# Altium footprint library 晶体管封装库.PcbLib: 101 footprints (part 3 of 7)
Each footprint in its own frame and in the unit in brackets; x right, y up, seen from the top. Pads: shape width x height; smd on the part's side, far side on the other; paste and mask are expansions set on the pad; w line width, h text height; cw(c..) or ccw(c..) is an arc to the next point about the centre after c.
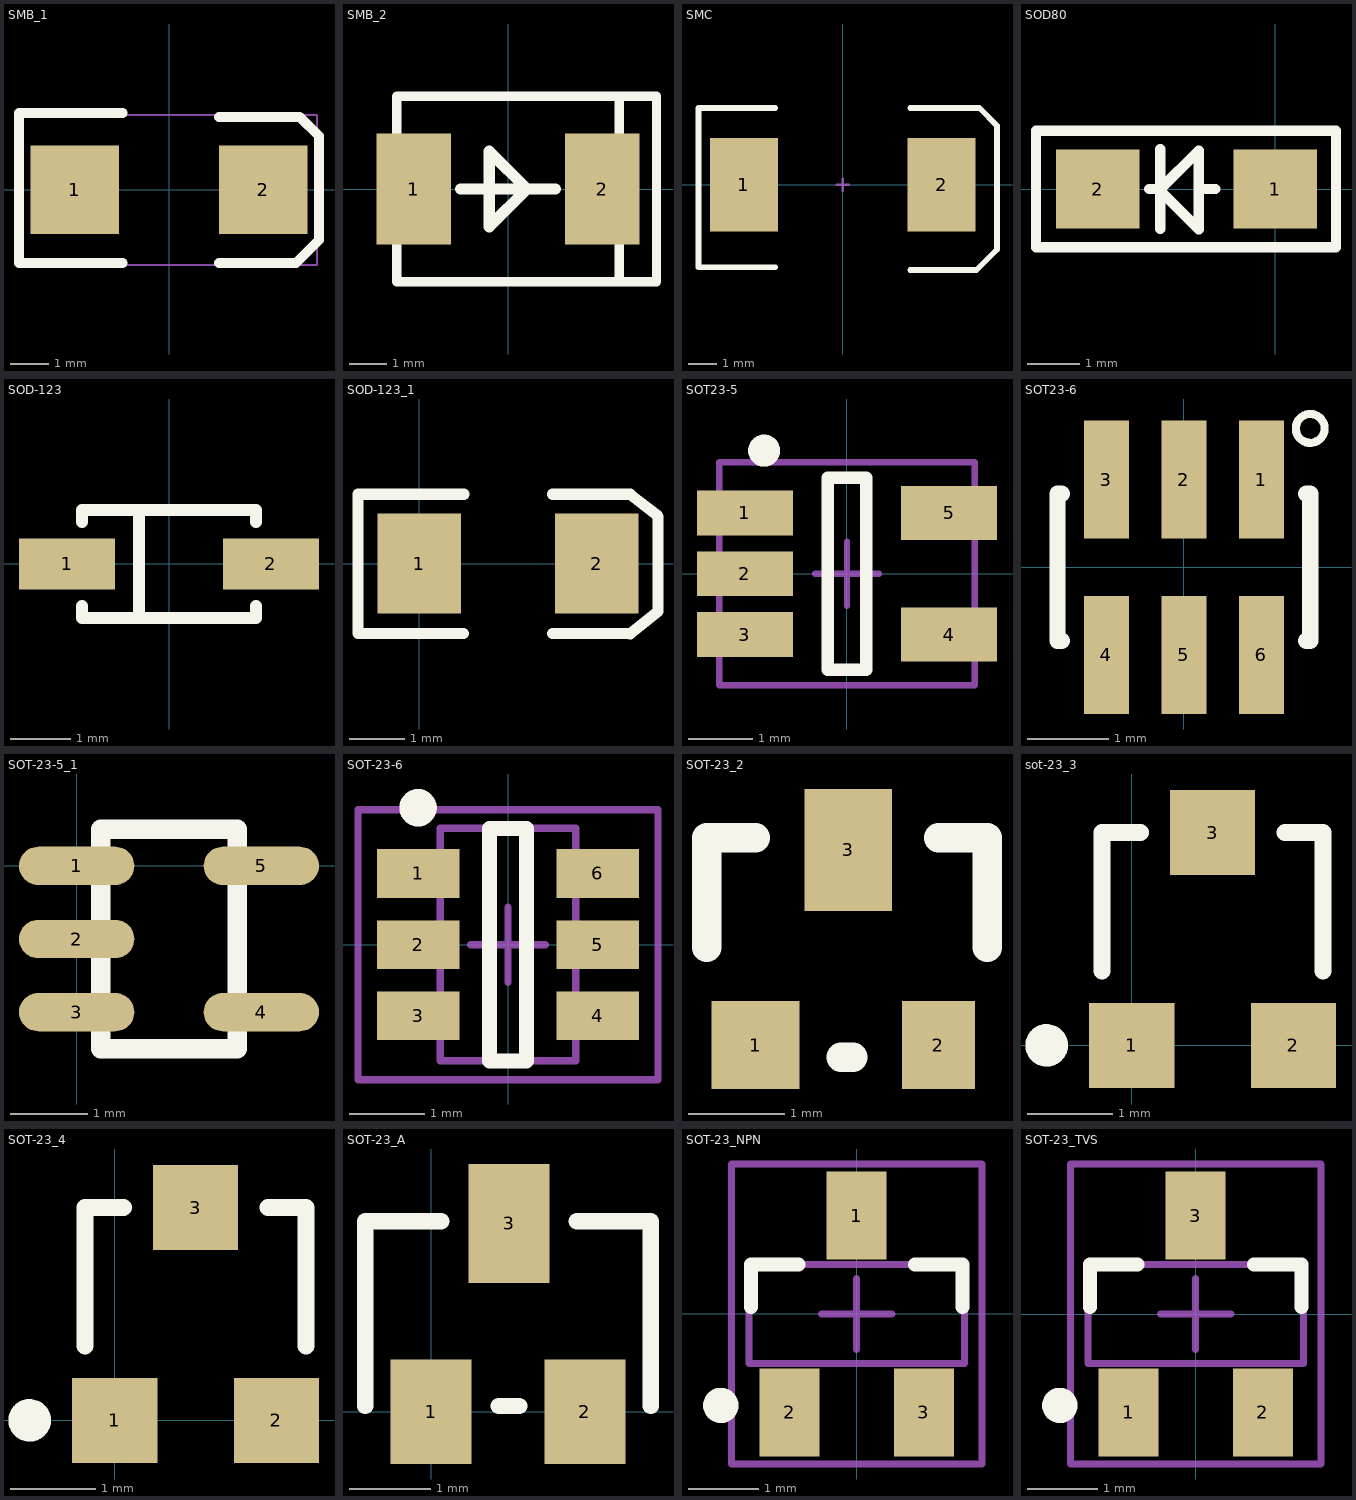
[diagram p2: the footprints below, top view; thin cyan lines are the x and y axes]

## SMB_1 [mm]
pads (2):
  rect 2.3x2.3 smd: 1(-2.45,0) 2(2.45,0)
Top Overlay:
  lines w0.254: -1.2,-1.9 -3.9,-1.9 -3.9,2 -1.2,2 ; 1.3,-1.9 3.3,-1.9 3.9,-1.3 3.9,1.4 3.4,1.9 1.3,1.9
Mechanical 16:
  lines w0.05: -3.85,-1.95 3.85,-1.95 3.85,1.95 -3.85,1.95 -3.85,-1.95
3D body: height 2.6, standoff -0.05, extent -2.794,-1.975 2.794,1.975

## SMB_2 [mm]
height 2
pads (2):
  rect 2x3 smd: 1(-2.54,0) 2(2.54,0)
Top Overlay:
  lines w0.254: -3,-1.5 -3,-2.5 3,-2.5 ; -3,1.5 -3,2.5 3,2.5 ; 3,-1.5 3,-2.5 ; 3,1.5 3,2.5 ; 3,-2.5 4,-2.5 4,2.5 3,2.5
  lines w0.305: -1.27,0 1.27,0 ; -0.508,-1.016 -0.508,1.016 0.508,0 -0.508,-1.016
3D body: height 2.2, standoff -0.05, extent -2.65,-1.85 2.65,1.85

## SMC [mm] "DO-214-AB/SMC; 2 C-Bend Leads; Body 7.9 x 5.9 mm, inc. leads (LxW)"
height 2.65
pads (2):
  rect 2.4x3.3 smd: 1(-3.475,0) 2(3.475,0)
Top Overlay:
  lines w0.2: -2.375,-2.9 -5.075,-2.9 -5.075,2.7 -2.375,2.7 ; 2.375,-3 4.7,-3 5.425,-2.275 5.425,2.073 4.804,2.7 2.375,2.7
Mechanical 1:
  lines w0.1: -0.2,0 0.2,0 ; 0,-0.2 0,0.2
3D body: height 2.57, standoff -0.07, extent -4.318,-3.15 3.81,3.15

## SOD80 [mm] "LL34"
pads (2):
  rect 1.6x1.524 smd: 1(0,0) 2(-3.4,0)
Top Overlay:
  lines w0.2: -4.588,1.092 -4.588,-1.118 1.168,-1.118 1.168,1.067 ; -4.588,1.118 1.168,1.118 ; -2.413,0 -2.2,0 ; -2.2,-0.762 -2.2,0.762 ; -1.463,0 -1.143,0 ; -2.2,0 -2.2,-0.035 -1.463,-0.772 -1.463,0.737 -2.2,0
3D body: height 1.5, standoff 0, extent -3.528,-0.75 -0.028,0.75

## SOD-123 [mm]
pads (2):
  rect 1.6x0.85 smd: 1(-1.7,0) 2(1.7,0)
Top Overlay:
  lines w0.2: -1.45,-0.7 -1.45,-0.9 1.45,-0.9 1.45,-0.7 ; -1.45,0.7 -1.45,0.9 1.45,0.9 1.45,0.7 ; -0.5,-0.9 -0.5,0.9
3D body: height 0.92, standoff -0.53, extent -1.925,-0.762 1.925,0.938

## SOD-123_1 [mm]
pads (2):
  rect 1.5x1.8 smd: 1(0,0) 2(3.2,0)
Top Overlay:
  lines w0.2: 0.8,-1.254 -1.1,-1.254 -1.1,1.25 0.805,1.25 ; 2.4,-1.254 3.8,-1.254 ; 2.4,1.25 3.8,1.25 ; 3.8,-1.259 4.3,-0.86 4.3,0.85 ; 3.8,1.244 4.29,0.87

## SOT23-5 [mm]
pads (5):
  rect 1.5x0.7 smd: 1(-1.595,0.95) 2(-1.595,0) 3(-1.595,-0.95)
  rect 1.5x0.85 smd: 4(1.595,-0.95) 5(1.595,0.95)
Top Overlay:
  circle w0.25: c-1.295,1.925 r0.125
  lines w0.2: -0.3,-1.5 0.3,-1.5 0.3,1.5 -0.3,1.5 -0.3,-1.5
Mechanical 15:
  lines w0.1: -0.5,0 0.5,0 ; 0,-0.5 0,0.5 ; -2,-1.745 -2,1.745 2,1.745 2,-1.745 -2,-1.745
3D body: height 1.09, standoff -0.01, extent -1.395,-1.46 1.406,1.44

## SOT23-6 [mm]
pads (6):
  rect 0.55x1.45 smd: 1(0.95,1.075) 2(0,1.075) 3(-0.95,1.075) 4(-0.95,-1.075) 5(0,-1.075) 6(0.95,-1.075)
Top Overlay:
  circle w0.1: c1.549,1.702 r0.177
  lines w0.2: -1.5,-0.9 -1.55,-0.9 -1.55,0.9 -1.5,0.9 ; 1.5,-0.9 1.55,-0.9 1.55,0.9 1.5,0.9
3D body: height 1.08, standoff -0.01, extent -1.397,-1.194 1.397,1.232

## SOT-23-5_1 [mm]
height 1.45
pads (5):
  oval 1.5x0.5 smd: 1(0,0) 2(0,-0.95) 3(0,-1.9) 4(2.4,-1.9) 5(2.4,0)
Top Overlay:
  lines w0.254: 0.962,-2.375 2.089,-2.375 2.089,0.475 0.311,0.475 0.311,-2.375 1.438,-2.375
3D body: height 1.2, standoff 0, extent -0.2,-2.4 2.6,0.5

## SOT-23-6 [mm]
pads (6):
  rect 1.1x0.65 smd: 1(-1.2,0.95) 2(-1.2,0) 3(-1.2,-0.95) 4(1.2,-0.95) 5(1.2,0) 6(1.2,0.95)
Top Overlay:
  circle w0.25: c-1.2,1.825 r0.125
  lines w0.2: -0.25,-1.55 -0.25,1.55 0.25,1.55 0.25,-1.55 -0.25,-1.55
Mechanical 13:
  lines w0.1: -0.9,-1.55 0.9,-1.55 0.9,1.55 -0.9,1.55 -0.9,-1.55
Mechanical 15:
  lines w0.1: -0.5,0 0.5,0 ; 0,-0.5 0,0.5 ; -2,-1.8 2,-1.8 2,1.8 -2,1.8 -2,-1.8
3D body: height 1.08, standoff -0.01, extent -1.308,-1.397 1.118,1.397

## SOT-23_2 [mil]
pads (3):
  rect 36x36 smd: 1(47.76,-120.28)
  rect 30x36 smd: 2(122.75,-120.28)
  rect 36x50 smd: 3(85.75,-40.28)
Top Overlay:
  lines w12: 27.75,-80.28 27.75,-35.28 47.76,-35.28 ; 82.75,-125.28 87.75,-125.28 ; 122.75,-35.28 142.75,-35.28 142.75,-80.28

## sot-23_3 [mm]
height 1
pads (3):
  rect 1x1 smd: 1(0,0) 2(1.9,0) 3(0.95,2.5)
Top Overlay:
  circle w0.25: c-1,0 r0.125
  lines w0.2: -0.35,0.875 -0.35,2.5 0.1,2.5 ; 1.8,2.5 2.25,2.5 2.25,0.875
3D body: height 1.2, standoff 0, extent -0.5,-0.15 2.4,2.65

## SOT-23_4 [mm]
pads (3):
  rect 1x1 smd: 1(0,0) 2(1.9,0) 3(0.95,2.5)
Top Overlay:
  circle w0.25: c-1,0 r0.125
  lines w0.2: -0.35,0.875 -0.35,2.5 0.1,2.5 ; 1.8,2.5 2.25,2.5 2.25,0.875
3D body: height 1.2, standoff 0, extent -0.5,-0.15 2.4,2.65

## SOT-23_A [mm]
pads (3):
  rect 1x1.29 smd: 1(0,0) 2(1.905,0)
  rect 1x1.47 smd: 3(0.965,2.332)
Top Overlay:
  lines w0.2: -0.813,0.073 -0.813,2.359 0.127,2.359 ; 0.838,0.073 1.092,0.073 ; 1.803,2.359 2.718,2.359 2.718,0.073

## SOT-23_NPN [mm]
pads (3):
  rect 0.85x1.25 smd: 1(0,1.395) 2(-0.95,-1.395) 3(0.95,-1.395)
Top Overlay:
  circle w0.25: c-1.925,-1.295 r0.125
  lines w0.2: -1.5,0.1 -1.5,0.7 -0.825,0.7 ; 0.825,0.7 1.5,0.7 1.5,0.1
Mechanical 13:
  lines w0.1: -1.525,-0.7 -1.525,0.7 1.525,0.7 1.525,-0.7 -1.525,-0.7
Mechanical 15:
  lines w0.1: -0.5,0 0.5,0 ; 0,-0.5 0,0.5 ; -1.775,-2.125 -1.775,2.125 1.775,2.125 1.775,-2.125 -1.775,-2.125
3D body: height 1.04, standoff -0.03, extent -1.447,-1.124 1.473,1.174

## SOT-23_TVS [mm]
pads (3):
  rect 0.85x1.25 smd: 1(-0.95,-1.395) 2(0.95,-1.395) 3(0,1.395)
Top Overlay:
  circle w0.25: c-1.925,-1.295 r0.125
  lines w0.2: -1.5,0.1 -1.5,0.7 -0.825,0.7 ; 0.825,0.7 1.5,0.7 1.5,0.1
Mechanical 13:
  lines w0.1: -1.525,-0.7 1.525,-0.7 1.525,0.7 -1.525,0.7 -1.525,-0.7
Mechanical 15:
  lines w0.1: -0.5,0 0.5,0 ; 0,-0.5 0,0.5 ; -1.775,-2.125 1.775,-2.125 1.775,2.125 -1.775,2.125 -1.775,-2.125
3D body: height 1.04, standoff -0.03, extent -1.447,-1.124 1.473,1.174